# Altium footprint library TomvanRijn-PCB.PcbLib: 165 footprints (part 7 of 11)
Each footprint in its own frame and in the unit in brackets; x right, y up, seen from the top. Pads: shape width x height; smd on the part's side, far side on the other; paste and mask are expansions set on the pad; w line width, h text height; cw(c..) or ccw(c..) is an arc to the next point about the centre after c.
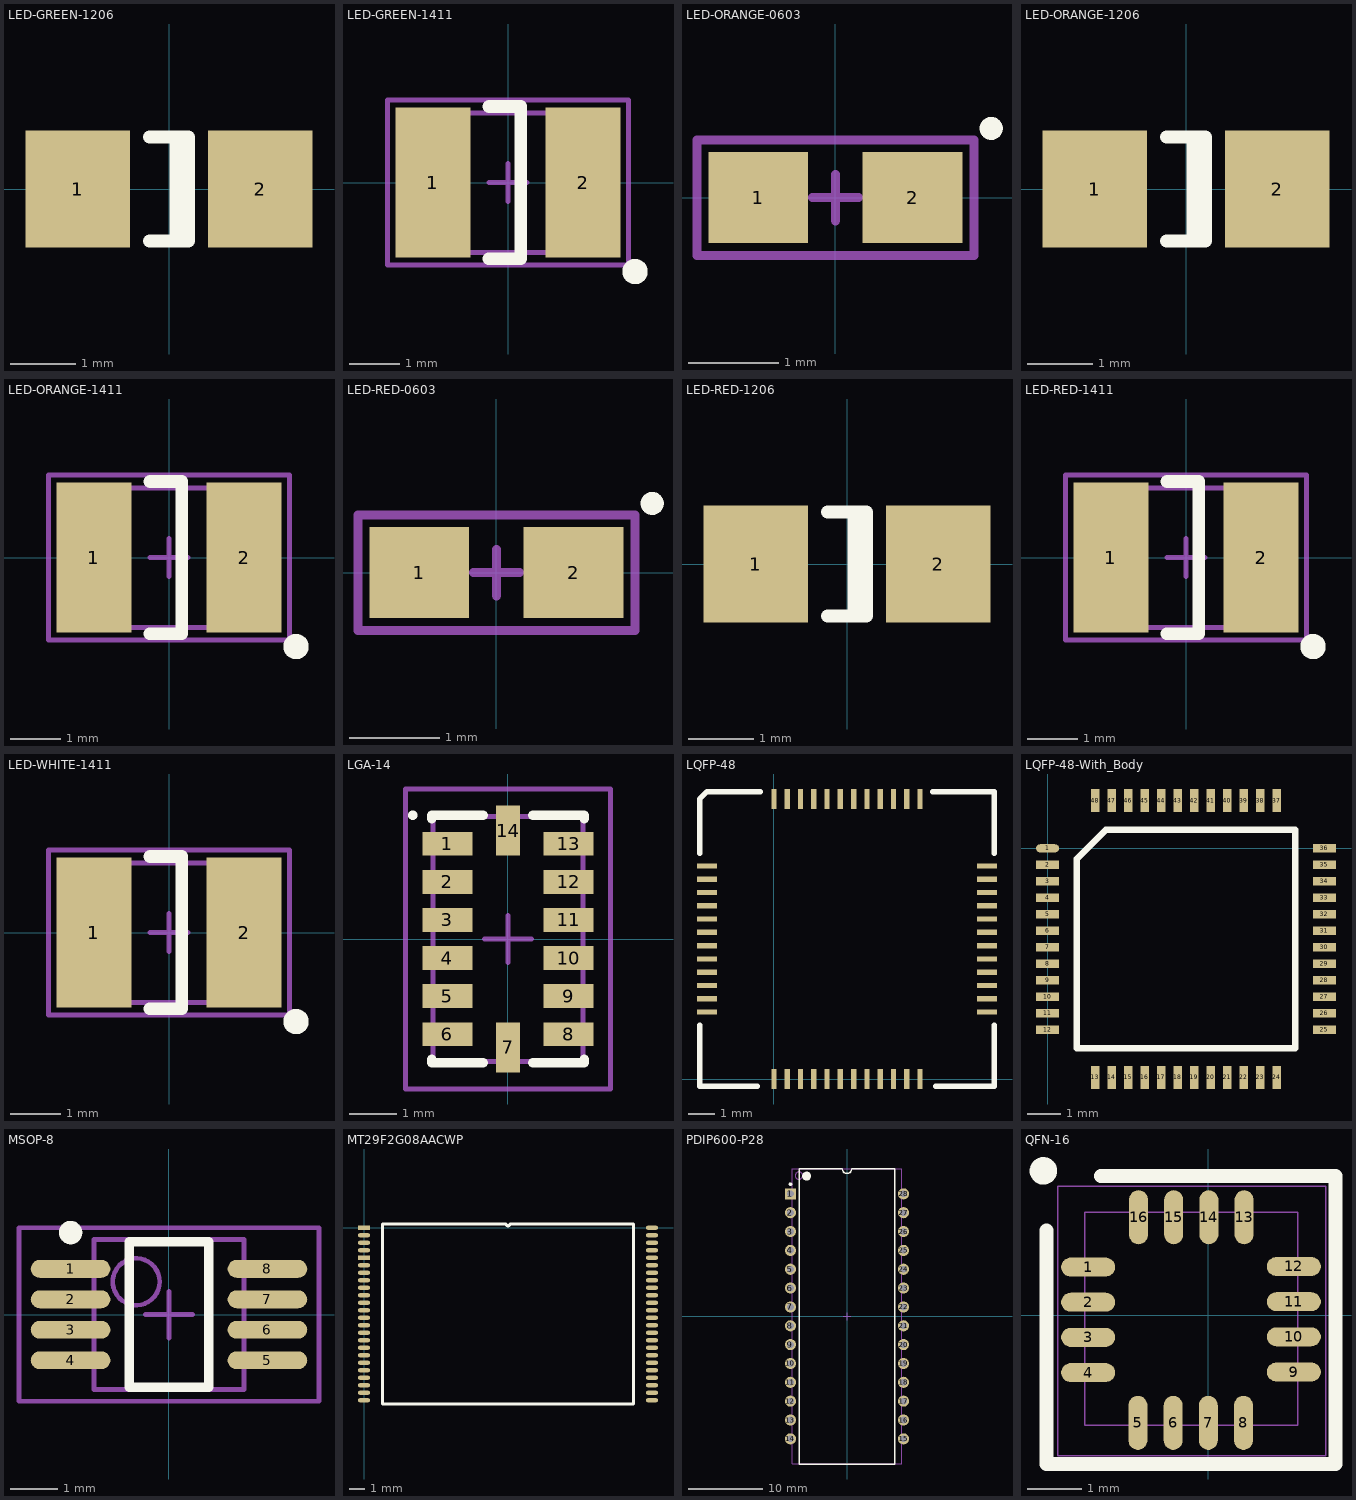
[diagram p6: the footprints below, top view; thin cyan lines are the x and y axes]

## LED-GREEN-1206 [mm] "SMD LED, green, 1206"
height 1.35
pads (2):
  rect 1.6x1.8 smd: 1(-1.4,0) 2(1.4,0)
Top Overlay:
  lines w0.2: -0.3,-0.8 0.3,-0.8 0.3,0.8 -0.3,0.8 ; 0.11,-0.8 0.11,0.8
3D body "1206-led-green.step": height 1.11, standoff -0.4, extent -1.6,-0.787 1.6,0.813

## LED-GREEN-1411 [mm] "Led, Green, 2.8 mm x 3.5 mm body, SMD"
height 1.9
pads (2):
  rect 1.5x3 smd: 1(-1.5,0) 2(1.5,0)
Top Overlay:
  circle w0.254: c2.54,-1.778 r0.127
  lines w0.254: -0.381,-1.524 0.254,-1.524 0.254,1.524 -0.381,1.524
Mechanical 13:
  lines w0.1: -1.778,-1.397 -1.778,1.397 1.778,1.397 1.778,-1.397 -1.778,-1.397
Mechanical 15:
  lines w0.1: -0.381,0 0.381,0 ; 0,-0.381 0,0.381 ; -2.413,-1.651 2.413,-1.651 2.413,1.651 -2.413,1.651 -2.413,-1.651
3D body: height 1.1, standoff 0.6, extent -1.19,-1.198 1.2,1.198
3D body "User Library-LED SMD Mini LED super red.step": height 1.75, standoff -0.06, extent -1.75,-1.4 1.75,1.4

## LED-ORANGE-0603 [mm] "SMD LED, Orange, 0603"
height 1.143
pads (2):
  rect 1.1x1 smd: 1(-0.85,0) 2(0.85,0)
Top Overlay:
  circle w0.127: c1.714,0.762 r0.064
Mechanical 15:
  lines w0.1: -0.254,0 0.254,0 ; 0,-0.254 0,0.254 ; -1.524,-0.635 -1.524,0.635 1.524,0.635 1.524,-0.635 -1.524,-0.635
3D body "User Library-led0603_YEL.step": height 1.1, standoff 0, extent -0.81,-0.4 0.81,0.4

## LED-ORANGE-1206 [mm] "SMD LED, orange, 1206"
height 1.35
pads (2):
  rect 1.6x1.8 smd: 1(-1.4,0) 2(1.4,0)
Top Overlay:
  lines w0.2: -0.3,-0.8 0.3,-0.8 0.3,0.8 -0.3,0.8 ; 0.11,-0.8 0.11,0.8
3D body "1206-led-orange.step": height 1.11, standoff -0.4, extent -1.6,-0.787 1.6,0.813

## LED-ORANGE-1411 [mm] "Led, Orange, 2.8 mm x 3.5 mm body, SMD"
height 1.9
pads (2):
  rect 1.5x3 smd: 1(-1.5,0) 2(1.5,0)
Top Overlay:
  circle w0.254: c2.54,-1.778 r0.127
  lines w0.254: -0.381,-1.524 0.254,-1.524 0.254,1.524 -0.381,1.524
Mechanical 13:
  lines w0.1: -1.778,-1.397 -1.778,1.397 1.778,1.397 1.778,-1.397 -1.778,-1.397
Mechanical 15:
  lines w0.1: -0.381,0 0.381,0 ; 0,-0.381 0,0.381 ; -2.413,-1.651 2.413,-1.651 2.413,1.651 -2.413,1.651 -2.413,-1.651
3D body: height 1.1, standoff 0.6, extent -1.19,-1.198 1.2,1.198
3D body "User Library-LED SMD Mini LED super red.step": height 1.75, standoff -0.06, extent -1.75,-1.4 1.75,1.4

## LED-RED-0603 [mm] "SMD LED, Red, 0603"
height 1.143
pads (2):
  rect 1.1x1 smd: 1(-0.85,0) 2(0.85,0)
Top Overlay:
  circle w0.127: c1.714,0.762 r0.064
Mechanical 15:
  lines w0.1: -0.254,0 0.254,0 ; 0,-0.254 0,0.254 ; -1.524,-0.635 -1.524,0.635 1.524,0.635 1.524,-0.635 -1.524,-0.635
3D body "User Library-led0603_RED.step": height 1.1, standoff 0, extent -0.81,-0.4 0.81,0.4

## LED-RED-1206 [mm] "SMD LED, red, 1206"
height 1.35
pads (2):
  rect 1.6x1.8 smd: 1(-1.4,0) 2(1.4,0)
Top Overlay:
  lines w0.2: -0.3,-0.8 0.3,-0.8 0.3,0.8 -0.3,0.8 ; 0.11,-0.8 0.11,0.8
3D body "1206-led-red.step": height 1.11, standoff -0.4, extent -1.6,-0.787 1.6,0.813

## LED-RED-1411 [mm] "Led, RED, 2.8 mm x 3.5 mm body, SMD"
height 1.9
pads (2):
  rect 1.5x3 smd: 1(-1.5,0) 2(1.5,0)
Top Overlay:
  circle w0.254: c2.54,-1.778 r0.127
  lines w0.254: -0.381,-1.524 0.254,-1.524 0.254,1.524 -0.381,1.524
Mechanical 13:
  lines w0.1: -1.778,-1.397 -1.778,1.397 1.778,1.397 1.778,-1.397 -1.778,-1.397
Mechanical 15:
  lines w0.1: -0.381,0 0.381,0 ; 0,-0.381 0,0.381 ; -2.413,-1.651 -2.413,1.651 2.413,1.651 2.413,-1.651 -2.413,-1.651
3D body "User Library-LED SMD Mini LED super red.step": height 1.75, standoff -0.06, extent -1.75,-1.4 1.75,1.4
3D body: height 1.1, standoff 0.6, extent -1.19,-1.198 1.2,1.198

## LED-WHITE-1411 [mm] "Led, White, 2.8 mm x 3.5 mm body, SMD"
height 1.9
pads (2):
  rect 1.5x3 smd: 1(-1.5,0) 2(1.5,0)
Top Overlay:
  circle w0.254: c2.54,-1.778 r0.127
  lines w0.254: -0.381,-1.524 0.254,-1.524 0.254,1.524 -0.381,1.524
Mechanical 13:
  lines w0.1: -1.778,-1.397 1.778,-1.397 1.778,1.397 -1.778,1.397 -1.778,-1.397
Mechanical 15:
  lines w0.1: -0.381,0 0.381,0 ; 0,-0.381 0,0.381 ; -2.413,-1.651 2.413,-1.651 2.413,1.651 -2.413,1.651 -2.413,-1.651
3D body "User Library-LED SMD Mini LED super red.step": height 1.75, standoff -0.06, extent -1.75,-1.4 1.75,1.4
3D body: height 1.1, standoff 0.6, extent -1.19,-1.198 1.2,1.198

## LGA-14 [mm] "LGA, 14-Leads, Body 3x5x0.92mm, Pitch 0.8mm, IPC Medium Density"
height 1
pads (14):
  rect 1.05x0.5 smd: 1(-1.275,2) 2(-1.275,1.2) 3(-1.275,0.4) 4(-1.275,-0.4) 5(-1.275,-1.2) 6(-1.275,-2) 8(1.275,-2) 9(1.275,-1.2) 10(1.275,-0.4) 11(1.275,0.4) 12(1.275,1.2) 13(1.275,2)
  rect 0.5x1.05 smd: 7(0,-2.275) 14(0,2.275)
Top Overlay:
  circle w0.1: c-2,2.6 r0.05
  lines w0.2: -1.6,-2.525 -1.6,-2.6 -0.525,-2.6 ; -1.6,2.525 -1.6,2.6 -0.525,2.6 ; 0.525,-2.6 1.6,-2.6 1.6,-2.525 ; 0.525,2.6 1.6,2.6 1.6,2.525
Mechanical 13:
  lines w0.1: -1.575,-2.575 1.575,-2.575 1.575,2.575 -1.575,2.575 -1.575,-2.575
Mechanical 15:
  lines w0.1: -0.5,0 0.5,0 ; 0,-0.5 0,0.5 ; -2.15,-3.15 2.15,-3.15 2.15,3.15 -2.15,3.15 -2.15,-3.15
3D body "LGA-14.step": height 1.03, standoff -0.4, extent -1.506,-2.468 1.494,2.532

## LQFP-48 [mm]
pads (48):
  rect 0.2x0.75 smd: 1(0,0) 2(0.5,0) 3(1,0) 4(1.5,0) 5(2,0) 6(2.5,0) 7(3,0) 8(3.5,0) 9(4,0) 10(4.5,0) 11(5,0) 12(5.5,0) 25(5.5,10.55) 26(5,10.55) 27(4.5,10.55) 28(4,10.55) 29(3.5,10.55) 30(3,10.55) 31(2.5,10.55) 32(2,10.55) 33(1.5,10.55) 34(1,10.55) 35(0.5,10.55) 36(0,10.55)
  rect 0.75x0.2 smd: 13(8.025,2.525) 14(8.025,3.025) 15(8.025,3.525) 16(8.025,4.025) 17(8.025,4.525) 18(8.025,5.025) 19(8.025,5.525) 20(8.025,6.025) 21(8.025,6.525) 22(8.025,7.025) 23(8.025,7.525) 24(8.025,8.025) 37(-2.525,8.025) 38(-2.525,7.525) 39(-2.525,7.025) 40(-2.525,6.525) 41(-2.525,6.025) 42(-2.525,5.525) 43(-2.525,5.025) 44(-2.525,4.525) 45(-2.525,4.025) 46(-2.525,3.525) 47(-2.525,3.025) 48(-2.525,2.525)
Top Overlay:
  lines w0.2: -2.8,2.032 -2.8,-0.275 -0.635,-0.275 ; -2.8,8.509 -2.8,10.55 -2.525,10.825 -0.508,10.825 ; 5.969,10.825 8.3,10.825 8.3,8.509 ; 6.096,-0.275 8.3,-0.275 8.3,2.032

## LQFP-48-With_Body [mm]
pads (48):
  oval 0.7x0.25 smd: 1(0,0)
  rect 0.7x0.25 smd: 2(0,-0.5) 3(0,-1) 4(0,-1.5) 5(0,-2) 6(0,-2.5) 7(0,-3) 8(0,-3.5) 9(0,-4) 10(0,-4.5) 11(0,-5) 12(0,-5.5) 25(8.4,-5.5) 26(8.4,-5) 27(8.4,-4.5) 28(8.4,-4) 29(8.4,-3.5) 30(8.4,-3) 31(8.4,-2.5) 32(8.4,-2) 33(8.4,-1.5) 34(8.4,-1) 35(8.4,-0.5) 36(8.4,0)
  rect 0.25x0.7 smd: 13(1.45,-6.95) 14(1.95,-6.95) 15(2.45,-6.95) 16(2.95,-6.95) 17(3.45,-6.95) 18(3.95,-6.95) 19(4.45,-6.95) 20(4.95,-6.95) 21(5.45,-6.95) 22(5.95,-6.95) 23(6.45,-6.95) 24(6.95,-6.95) 37(6.95,1.45) 38(6.45,1.45) 39(5.95,1.45) 40(5.45,1.45) 41(4.95,1.45) 42(4.45,1.45) 43(3.95,1.45) 44(3.45,1.45) 45(2.95,1.45) 46(2.45,1.45) 47(1.95,1.45) 48(1.45,1.45)
Top Overlay:
  lines w0.2: 0.885,-6.065 7.515,-6.065 7.515,0.565 1.77,0.565 0.885,-0.32 0.885,-6.065
3D body "User Library-LQFP48_Grid_0_5.STEP": height 1.6, standoff 0, extent -0.3,-7.25 8.7,1.75

## MSOP-8 [mm] "TSOP, 8-Leads, Body 3x3mm, Pitch 0.65mm"
height 1.1
pads (8):
  oval 1.7x0.381 smd: 1(-2.1,0.975) 2(-2.1,0.325) 3(-2.1,-0.325) 4(-2.1,-0.975) 5(2.1,-0.975) 6(2.1,-0.325) 7(2.1,0.325) 8(2.1,0.975)
Top Overlay:
  circle w0.25: c-2.1,1.75 r0.125
  lines w0.2: -0.85,-1.55 0.85,-1.55 0.85,1.55 -0.85,1.55 -0.85,-1.55
Mechanical 13:
  circle w0.1: c-0.7,0.7 r0.5
  lines w0.1: -1.6,-1.6 1.6,-1.6 1.6,1.6 -1.6,1.6 -1.6,-1.6
Mechanical 15:
  lines w0.1: -0.5,0 0.5,0 ; 0,-0.5 0,0.5 ; -3.2,-1.85 3.2,-1.85 3.2,1.85 -3.2,1.85 -3.2,-1.85
3D body "MSOP-8.step": height 1.15, standoff 0, extent -2.45,-1.5 2.45,1.5

## MT29F2G08AACWP [mm] "Decodes MPEG 1.0 & 2.0 audio layer  III"
pads (48):
  rect 0.8x0.27 smd: 1(0,0) 5(0,-2)
  oval 0.8x0.27 smd: 2(0,-0.5) 3(0,-1) 4(0,-1.5) 6(0,-2.5) 7(0,-3) 8(0,-3.5) 9(0,-4) 10(0,-4.5) 11(0,-5) 12(0,-5.5) 13(0,-6) 14(0,-6.5) 15(0,-7) 16(0,-7.5) 17(0,-8) 18(0,-8.5) 19(0,-9) 20(0,-9.5) 21(0,-10) 22(0,-10.5) 23(0,-11) 24(0,-11.5) 25(19.2,-11.5) 26(19.2,-11) 27(19.2,-10.5) 28(19.2,-10) 29(19.2,-9.5) 30(19.2,-9) 31(19.2,-8.5) 32(19.2,-8) 33(19.2,-7.5) 34(19.2,-7) 35(19.2,-6.5) 36(19.2,-6) 37(19.2,-5.5) 38(19.2,-5) 39(19.2,-4.5) 40(19.2,-4) 41(19.2,-3.5) 42(19.2,-3) 43(19.2,-2.5) 44(19.2,-2) 45(19.2,-1.5) 46(19.2,-1) 47(19.2,-0.5) 48(19.2,0)
Top Overlay:
  lines w0.2: 1.235,-11.75 17.965,-11.75 17.965,0.25 9.725,0.25 cw(c9.6,0.25) 9.475,0.25 1.235,0.25 1.235,-11.75

## PDIP600-P28 [mm] "DIP, 28-Leads, Row Spacing 15.24mm, Pitch 2.54mm, Body 37.4x13.5mm"
height 6.35
pads (28):
  rect 1.5x1.5 hole 0.9: 1(-7.62,16.51)
  round 1.5 hole 0.9: 2(-7.62,13.97) 3(-7.62,11.43) 4(-7.62,8.89) 5(-7.62,6.35) 6(-7.62,3.81) 7(-7.62,1.27) 8(-7.62,-1.27) 9(-7.62,-3.81) 10(-7.62,-6.35) 11(-7.62,-8.89) 12(-7.62,-11.43) 13(-7.62,-13.97) 14(-7.62,-16.51) 15(7.62,-16.51) 16(7.62,-13.97) 17(7.62,-11.43) 18(7.62,-8.89) 19(7.62,-6.35) 20(7.62,-3.81) 21(7.62,-1.27) 22(7.62,1.27) 23(7.62,3.81) 24(7.62,6.35) 25(7.62,8.89) 26(7.62,11.43) 27(7.62,13.97) 28(7.62,16.51)
Top Overlay:
  circle w0.25: c-7.62,17.81 r0.125
  circle w0.6: c-5.45,18.9 r0.3
  lines w0.2: -6.45,-19.9 -6.45,19.9 -0.635,19.9 ccw(c0,19.9) 0.635,19.9 6.45,19.9 6.45,-19.9 -6.45,-19.9
Mechanical 13:
  circle w0.1: c-6.475,18.975 r0.5
  lines w0.1: -7.375,-19.875 -7.375,19.875 7.375,19.875 7.375,-19.875 -7.375,-19.875
Mechanical 15:
  lines w0.1: -0.5,0 0.5,0 ; 0,-0.5 0,0.5
3D body "User Library-DIP28 Wide.STEP": height 5.09, standoff -3.81, extent -7.72,-18.67 7.72,18.67

## QFN-16 [mm] "QFN-16, 4x4 mm leadless"
height 0.102
pads (16):
  oval 1x0.35 smd paste+0.001 mask+0.14: 1(-2.22,0.89) 2(-2.22,0.24) 3(-2.22,-0.41) 4(-2.22,-1.06) 9(1.58,-1.05) 10(1.58,-0.4) 11(1.58,0.25) 12(1.58,0.9)
  oval 0.35x1 smd paste+0.001 mask+0.14: 5(-1.3,-1.99) 6(-0.65,-1.99) 7(0,-1.99) 8(0.65,-1.99) 13(0.66,1.81) 14(0.01,1.81) 15(-0.64,1.81) 16(-1.29,1.81)
Top Overlay:
  circle w0.254: c-3.048,2.667 r0.127
  lines w0.254: -2.99,1.57 -2.99,-2.75 2.35,-2.75 2.35,2.57 -1.99,2.57
Mechanical 1:
  lines w0.025: -3,1.57 -3,-2.75 2.34,-2.75 2.34,2.57 -1.99,2.57
Mechanical 13:
  lines w0.025: -2.286,-2.032 1.651,-2.032 1.651,1.905 -2.286,1.905 -2.286,-2.032
Mechanical 15:
  lines w0.025: -2.782,-2.601 -2.782,2.382 2.168,2.382 2.168,-2.601 -2.782,-2.601
3D body "User Library-qfn16-4x4.step": height 0.92, standoff 0, extent -2.254,-2.127 1.746,1.873